# Altium footprint library con-samtec.PCBLIB: 805 footprints (part 31 of 55)
Each footprint in its own frame and in the unit in brackets; x right, y up, seen from the top. Pads: shape width x height; smd on the part's side, far side on the other; paste and mask are expansions set on the pad; w line width, h text height; cw(c..) or ccw(c..) is an arc to the next point about the centre after c.
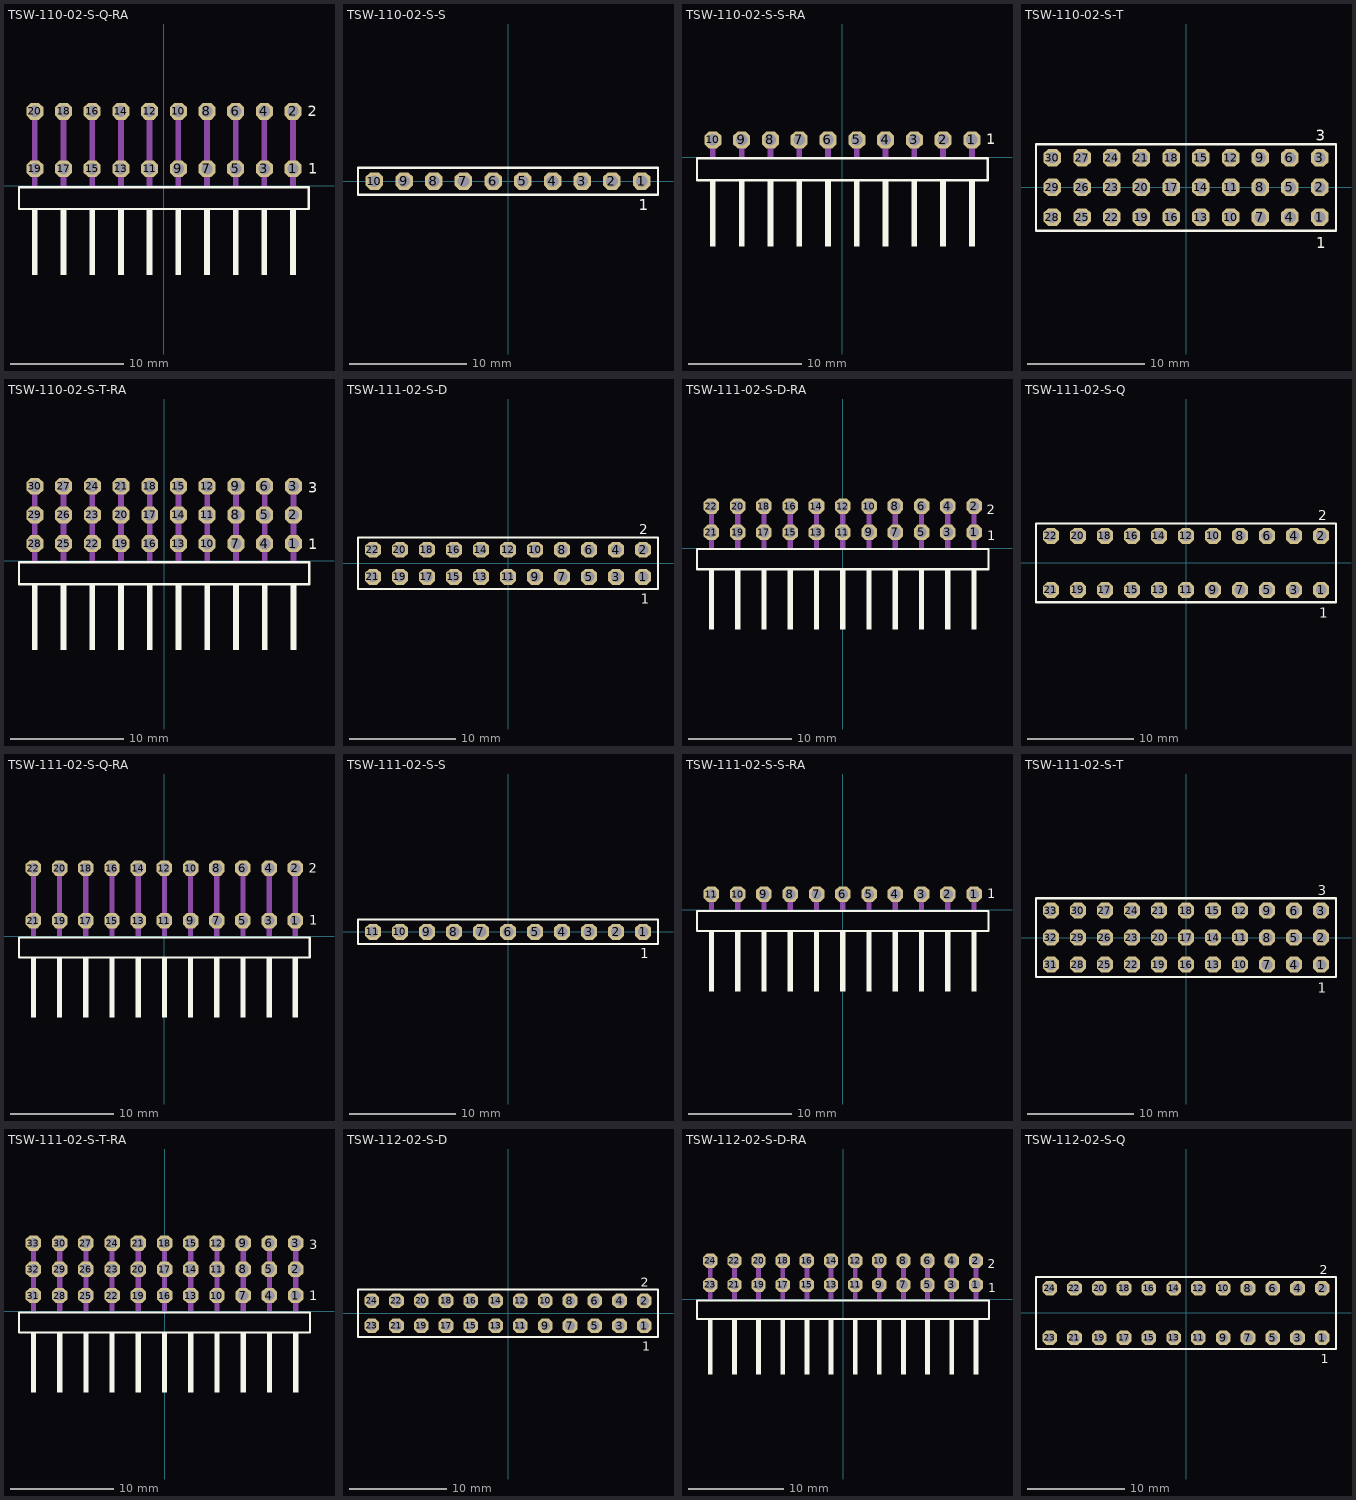
[diagram p30: the footprints below, top view; thin cyan lines are the x and y axes]

## TSW-110-02-S-Q-RA [mil]
pads (20):
  oct 59.06x59.06 hole 39.37: 1(450,60) 2(450,260) 3(350,60) 4(350,260) 5(250,60) 6(250,260) 7(150,60) 8(150,260) 9(50,60) 10(50,260) 11(-50,60) 12(-50,260) 13(-150,60) 14(-150,260) 15(-250,60) 16(-250,260) 17(-350,60) 18(-350,260) 19(-450,60) 20(-450,260)
Top Overlay:
  rectangle: -460,-310.63 -440,-80.32
  rectangle: -360,-310.63 -340,-80.32
  rectangle: -260,-310.63 -240,-80.32
  rectangle: -160,-310.63 -140,-80.32
  rectangle: -60,-310.63 -40,-80.32
  rectangle: 40,-310.63 60,-80.32
  rectangle: 140,-310.63 160,-80.32
  rectangle: 240,-310.63 260,-80.32
  rectangle: 340,-310.63 360,-80.32
  rectangle: 440,-310.63 460,-80.32
  lines w8: -505.08,-80.55 505.08,-80.55 505.08,-4.17 -505.08,-4.17 -505.08,-80.55
  text "1" at 503.54,43.31 h36.81
  text "2" at 501.18,242.72 h36.81
Mechanical 16:
  rectangle: -460,0 -440,270
  rectangle: -360,0 -340,270
  rectangle: -260,0 -240,270
  rectangle: -160,0 -140,270
  rectangle: -60,0 -40,270
  rectangle: 40,0 60,270
  rectangle: 140,0 160,270
  rectangle: 240,0 260,270
  rectangle: 340,0 360,270
  rectangle: 440,0 460,270

## TSW-110-02-S-S [mm]
pads (10):
  oct 1.5x1.5 hole 1: 1(11.43,0) 2(8.89,0) 3(6.35,0) 4(3.81,0) 5(1.27,0) 6(-1.27,0) 7(-3.81,0) 8(-6.35,0) 9(-8.89,0) 10(-11.43,0)
Top Overlay:
  lines w0.203: -12.829,-1.155 12.829,-1.155 12.829,1.155 -12.829,1.155 -12.829,-1.155
  text "1" at 11.172,-2.498 h0.94
Mechanical 16:
  rectangle: -11.78,-0.35 -11.08,0.35
  rectangle: -9.24,-0.35 -8.54,0.35
  rectangle: -6.7,-0.35 -6,0.35
  rectangle: -4.16,-0.35 -3.46,0.35
  rectangle: -1.62,-0.35 -0.92,0.35
  rectangle: 0.92,-0.35 1.62,0.35
  rectangle: 3.46,-0.35 4.16,0.35
  rectangle: 6,-0.35 6.7,0.35
  rectangle: 8.54,-0.35 9.24,0.35
  rectangle: 11.08,-0.35 11.78,0.35

## TSW-110-02-S-S-RA [mil]
pads (10):
  oct 59.06x59.06 hole 39.37: 1(450,60) 2(350,60) 3(250,60) 4(150,60) 5(50,60) 6(-50,60) 7(-150,60) 8(-250,60) 9(-350,60) 10(-450,60)
Top Overlay:
  rectangle: -460,-310.63 -440,-80.32
  rectangle: -360,-310.63 -340,-80.32
  rectangle: -260,-310.63 -240,-80.32
  rectangle: -160,-310.63 -140,-80.32
  rectangle: -60,-310.63 -40,-80.32
  rectangle: 40,-310.63 60,-80.32
  rectangle: 140,-310.63 160,-80.32
  rectangle: 240,-310.63 260,-80.32
  rectangle: 340,-310.63 360,-80.32
  rectangle: 440,-310.63 460,-80.32
  lines w8: -505.08,-80.55 505.08,-80.55 505.08,-4.17 -505.08,-4.17 -505.08,-80.55
  text "1" at 500.47,45.35 h36.81
Mechanical 16:
  rectangle: -460,0 -440,70
  rectangle: -360,0 -340,70
  rectangle: -260,0 -240,70
  rectangle: -160,0 -140,70
  rectangle: -60,0 -40,70
  rectangle: 40,0 60,70
  rectangle: 140,0 160,70
  rectangle: 240,0 260,70
  rectangle: 340,0 360,70
  rectangle: 440,0 460,70

## TSW-110-02-S-T [mm]
pads (30):
  oct 1.5x1.5 hole 1: 1(11.43,-2.54) 2(11.43,0) 3(11.43,2.54) 4(8.89,-2.54) 5(8.89,0) 6(8.89,2.54) 7(6.35,-2.54) 8(6.35,0) 9(6.35,2.54) 10(3.81,-2.54) 11(3.81,0) 12(3.81,2.54) 13(1.27,-2.54) 14(1.27,0) 15(1.27,2.54) 16(-1.27,-2.54) 17(-1.27,0) 18(-1.27,2.54) 19(-3.81,-2.54) 20(-3.81,0) 21(-3.81,2.54) 22(-6.35,-2.54) 23(-6.35,0) 24(-6.35,2.54) 25(-8.89,-2.54) 26(-8.89,0) 27(-8.89,2.54) 28(-11.43,-2.54) 29(-11.43,0) 30(-11.43,2.54)
Top Overlay:
  lines w0.203: -12.829,-3.695 12.829,-3.695 12.829,3.695 -12.829,3.695 -12.829,-3.695
  text "1" at 11.122,-5.188 h0.94
  text "3" at 11.118,3.989 h0.94
Mechanical 16:
  rectangle: -11.78,-2.89 -11.08,-2.19
  rectangle: -11.78,-0.35 -11.08,0.35
  rectangle: -11.78,2.19 -11.08,2.89
  rectangle: -9.24,-2.89 -8.54,-2.19
  rectangle: -9.24,-0.35 -8.54,0.35
  rectangle: -9.24,2.19 -8.54,2.89
  rectangle: -6.7,-2.89 -6,-2.19
  rectangle: -6.7,-0.35 -6,0.35
  rectangle: -6.7,2.19 -6,2.89
  rectangle: -4.16,-2.89 -3.46,-2.19
  rectangle: -4.16,-0.35 -3.46,0.35
  rectangle: -4.16,2.19 -3.46,2.89
  rectangle: -1.62,-2.89 -0.92,-2.19
  rectangle: -1.62,-0.35 -0.92,0.35
  rectangle: -1.62,2.19 -0.92,2.89
  rectangle: 0.92,-2.89 1.62,-2.19
  rectangle: 0.92,-0.35 1.62,0.35
  rectangle: 0.92,2.19 1.62,2.89
  rectangle: 3.46,-2.89 4.16,-2.19
  rectangle: 3.46,-0.35 4.16,0.35
  rectangle: 3.46,2.19 4.16,2.89
  rectangle: 6,-2.89 6.7,-2.19
  rectangle: 6,-0.35 6.7,0.35
  rectangle: 6,2.19 6.7,2.89
  rectangle: 8.54,-2.89 9.24,-2.19
  rectangle: 8.54,-0.35 9.24,0.35
  rectangle: 8.54,2.19 9.24,2.89
  rectangle: 11.08,-2.89 11.78,-2.19
  rectangle: 11.08,-0.35 11.78,0.35
  rectangle: 11.08,2.19 11.78,2.89

## TSW-110-02-S-T-RA [mil]
pads (30):
  oct 59.06x59.06 hole 39.37: 1(450,60) 2(450,160) 3(450,260) 4(350,60) 5(350,160) 6(350,260) 7(250,60) 8(250,160) 9(250,260) 10(150,60) 11(150,160) 12(150,260) 13(50,60) 14(50,160) 15(50,260) 16(-50,60) 17(-50,160) 18(-50,260) 19(-150,60) 20(-150,160) 21(-150,260) 22(-250,60) 23(-250,160) 24(-250,260) 25(-350,60) 26(-350,160) 27(-350,260) 28(-450,60) 29(-450,160) 30(-450,260)
Top Overlay:
  rectangle: -460,-310.63 -440,-80.32
  rectangle: -360,-310.63 -340,-80.32
  rectangle: -260,-310.63 -240,-80.32
  rectangle: -160,-310.63 -140,-80.32
  rectangle: -60,-310.63 -40,-80.32
  rectangle: 40,-310.63 60,-80.32
  rectangle: 140,-310.63 160,-80.32
  rectangle: 240,-310.63 260,-80.32
  rectangle: 340,-310.63 360,-80.32
  rectangle: 440,-310.63 460,-80.32
  lines w8: -505.08,-80.55 505.08,-80.55 505.08,-4.17 -505.08,-4.17 -505.08,-80.55
  text "1" at 501.57,41.34 h36.81
  text "3" at 502.17,236.81 h36.81
Mechanical 16:
  rectangle: -460,0 -440,270
  rectangle: -360,0 -340,270
  rectangle: -260,0 -240,270
  rectangle: -160,0 -140,270
  rectangle: -60,0 -40,270
  rectangle: 40,0 60,270
  rectangle: 140,0 160,270
  rectangle: 240,0 260,270
  rectangle: 340,0 360,270
  rectangle: 440,0 460,270

## TSW-111-02-S-D [mm]
pads (22):
  oct 1.5x1.5 hole 1: 1(12.7,-1.27) 2(12.7,1.27) 3(10.16,-1.27) 4(10.16,1.27) 5(7.62,-1.27) 6(7.62,1.27) 7(5.08,-1.27) 8(5.08,1.27) 9(2.54,-1.27) 10(2.54,1.27) 11(0,-1.27) 12(0,1.27) 13(-2.54,-1.27) 14(-2.54,1.27) 15(-5.08,-1.27) 16(-5.08,1.27) 17(-7.62,-1.27) 18(-7.62,1.27) 19(-10.16,-1.27) 20(-10.16,1.27) 21(-12.7,-1.27) 22(-12.7,1.27)
Top Overlay:
  lines w0.203: -14.099,-2.425 14.099,-2.425 14.099,2.425 -14.099,2.425 -14.099,-2.425
  text "1" at 12.492,-3.818 h0.94
  text "2" at 12.317,2.744 h0.94
Mechanical 16:
  rectangle: -13.05,-1.62 -12.35,-0.92
  rectangle: -13.05,0.92 -12.35,1.62
  rectangle: -10.51,-1.62 -9.81,-0.92
  rectangle: -10.51,0.92 -9.81,1.62
  rectangle: -7.97,-1.62 -7.27,-0.92
  rectangle: -7.97,0.92 -7.27,1.62
  rectangle: -5.43,-1.62 -4.73,-0.92
  rectangle: -5.43,0.92 -4.73,1.62
  rectangle: -2.89,-1.62 -2.19,-0.92
  rectangle: -2.89,0.92 -2.19,1.62
  rectangle: -0.35,-1.62 0.35,-0.92
  rectangle: -0.35,0.92 0.35,1.62
  rectangle: 2.19,-1.62 2.89,-0.92
  rectangle: 2.19,0.92 2.89,1.62
  rectangle: 4.73,-1.62 5.43,-0.92
  rectangle: 4.73,0.92 5.43,1.62
  rectangle: 7.27,-1.62 7.97,-0.92
  rectangle: 7.27,0.92 7.97,1.62
  rectangle: 9.81,-1.62 10.51,-0.92
  rectangle: 9.81,0.92 10.51,1.62
  rectangle: 12.35,-1.62 13.05,-0.92
  rectangle: 12.35,0.92 13.05,1.62

## TSW-111-02-S-D-RA [mil]
pads (22):
  oct 59.06x59.06 hole 39.37: 1(500,60) 2(500,160) 3(400,60) 4(400,160) 5(300,60) 6(300,160) 7(200,60) 8(200,160) 9(100,60) 10(100,160) 11(0,60) 12(0,160) 13(-100,60) 14(-100,160) 15(-200,60) 16(-200,160) 17(-300,60) 18(-300,160) 19(-400,60) 20(-400,160) 21(-500,60) 22(-500,160)
Top Overlay:
  rectangle: -510,-310.63 -490,-80.32
  rectangle: -410,-310.63 -390,-80.32
  rectangle: -310,-310.63 -290,-80.32
  rectangle: -210,-310.63 -190,-80.32
  rectangle: -110,-310.63 -90,-80.32
  rectangle: -10,-310.63 10,-80.32
  rectangle: 90,-310.63 110,-80.32
  rectangle: 190,-310.63 210,-80.32
  rectangle: 290,-310.63 310,-80.32
  rectangle: 390,-310.63 410,-80.32
  rectangle: 490,-310.63 510,-80.32
  lines w8: -555.08,-80.55 555.08,-80.55 555.08,-4.17 -555.08,-4.17 -555.08,-80.55
  text "1" at 550.59,30.51 h36.81
  text "2" at 549.21,129.53 h36.81
Mechanical 16:
  rectangle: -510,0 -490,170
  rectangle: -410,0 -390,170
  rectangle: -310,0 -290,170
  rectangle: -210,0 -190,170
  rectangle: -110,0 -90,170
  rectangle: -10,0 10,170
  rectangle: 90,0 110,170
  rectangle: 190,0 210,170
  rectangle: 290,0 310,170
  rectangle: 390,0 410,170
  rectangle: 490,0 510,170

## TSW-111-02-S-Q [mm]
pads (22):
  oct 1.5x1.5 hole 1: 1(12.7,-2.54) 2(12.7,2.54) 3(10.16,-2.54) 4(10.16,2.54) 5(7.62,-2.54) 6(7.62,2.54) 7(5.08,-2.54) 8(5.08,2.54) 9(2.54,-2.54) 10(2.54,2.54) 11(0,-2.54) 12(0,2.54) 13(-2.54,-2.54) 14(-2.54,2.54) 15(-5.08,-2.54) 16(-5.08,2.54) 17(-7.62,-2.54) 18(-7.62,2.54) 19(-10.16,-2.54) 20(-10.16,2.54) 21(-12.7,-2.54) 22(-12.7,2.54)
Top Overlay:
  lines w0.203: -14.099,-3.695 14.099,-3.695 14.099,3.695 -14.099,3.695 -14.099,-3.695
  text "1" at 12.542,-5.138 h0.94
  text "2" at 12.442,3.989 h0.94
Mechanical 16:
  rectangle: -13.05,-2.89 -12.35,-2.19
  rectangle: -13.05,2.19 -12.35,2.89
  rectangle: -10.51,-2.89 -9.81,-2.19
  rectangle: -10.51,2.19 -9.81,2.89
  rectangle: -7.97,-2.89 -7.27,-2.19
  rectangle: -7.97,2.19 -7.27,2.89
  rectangle: -5.43,-2.89 -4.73,-2.19
  rectangle: -5.43,2.19 -4.73,2.89
  rectangle: -2.89,-2.89 -2.19,-2.19
  rectangle: -2.89,2.19 -2.19,2.89
  rectangle: -0.35,-2.89 0.35,-2.19
  rectangle: -0.35,2.19 0.35,2.89
  rectangle: 2.19,-2.89 2.89,-2.19
  rectangle: 2.19,2.19 2.89,2.89
  rectangle: 4.73,-2.89 5.43,-2.19
  rectangle: 4.73,2.19 5.43,2.89
  rectangle: 7.27,-2.89 7.97,-2.19
  rectangle: 7.27,2.19 7.97,2.89
  rectangle: 9.81,-2.89 10.51,-2.19
  rectangle: 9.81,2.19 10.51,2.89
  rectangle: 12.35,-2.89 13.05,-2.19
  rectangle: 12.35,2.19 13.05,2.89

## TSW-111-02-S-Q-RA [mil]
pads (22):
  oct 59.06x59.06 hole 39.37: 1(500,60) 2(500,260) 3(400,60) 4(400,260) 5(300,60) 6(300,260) 7(200,60) 8(200,260) 9(100,60) 10(100,260) 11(0,60) 12(0,260) 13(-100,60) 14(-100,260) 15(-200,60) 16(-200,260) 17(-300,60) 18(-300,260) 19(-400,60) 20(-400,260) 21(-500,60) 22(-500,260)
Top Overlay:
  rectangle: -510,-310.63 -490,-80.32
  rectangle: -410,-310.63 -390,-80.32
  rectangle: -310,-310.63 -290,-80.32
  rectangle: -210,-310.63 -190,-80.32
  rectangle: -110,-310.63 -90,-80.32
  rectangle: -10,-310.63 10,-80.32
  rectangle: 90,-310.63 110,-80.32
  rectangle: 190,-310.63 210,-80.32
  rectangle: 290,-310.63 310,-80.32
  rectangle: 390,-310.63 410,-80.32
  rectangle: 490,-310.63 510,-80.32
  lines w8: -555.08,-80.55 555.08,-80.55 555.08,-4.17 -555.08,-4.17 -555.08,-80.55
  text "1" at 553.54,43.31 h36.81
  text "2" at 551.18,242.72 h36.81
Mechanical 16:
  rectangle: -510,0 -490,270
  rectangle: -410,0 -390,270
  rectangle: -310,0 -290,270
  rectangle: -210,0 -190,270
  rectangle: -110,0 -90,270
  rectangle: -10,0 10,270
  rectangle: 90,0 110,270
  rectangle: 190,0 210,270
  rectangle: 290,0 310,270
  rectangle: 390,0 410,270
  rectangle: 490,0 510,270

## TSW-111-02-S-S [mm]
pads (11):
  oct 1.5x1.5 hole 1: 1(12.7,0) 2(10.16,0) 3(7.62,0) 4(5.08,0) 5(2.54,0) 6(0,0) 7(-2.54,0) 8(-5.08,0) 9(-7.62,0) 10(-10.16,0) 11(-12.7,0)
Top Overlay:
  lines w0.203: -14.099,-1.155 14.099,-1.155 14.099,1.155 -14.099,1.155 -14.099,-1.155
  text "1" at 12.442,-2.498 h0.94
Mechanical 16:
  rectangle: -13.05,-0.35 -12.35,0.35
  rectangle: -10.51,-0.35 -9.81,0.35
  rectangle: -7.97,-0.35 -7.27,0.35
  rectangle: -5.43,-0.35 -4.73,0.35
  rectangle: -2.89,-0.35 -2.19,0.35
  rectangle: -0.35,-0.35 0.35,0.35
  rectangle: 2.19,-0.35 2.89,0.35
  rectangle: 4.73,-0.35 5.43,0.35
  rectangle: 7.27,-0.35 7.97,0.35
  rectangle: 9.81,-0.35 10.51,0.35
  rectangle: 12.35,-0.35 13.05,0.35

## TSW-111-02-S-S-RA [mil]
pads (11):
  oct 59.06x59.06 hole 39.37: 1(500,60) 2(400,60) 3(300,60) 4(200,60) 5(100,60) 6(0,60) 7(-100,60) 8(-200,60) 9(-300,60) 10(-400,60) 11(-500,60)
Top Overlay:
  rectangle: -510,-310.63 -490,-80.32
  rectangle: -410,-310.63 -390,-80.32
  rectangle: -310,-310.63 -290,-80.32
  rectangle: -210,-310.63 -190,-80.32
  rectangle: -110,-310.63 -90,-80.32
  rectangle: -10,-310.63 10,-80.32
  rectangle: 90,-310.63 110,-80.32
  rectangle: 190,-310.63 210,-80.32
  rectangle: 290,-310.63 310,-80.32
  rectangle: 390,-310.63 410,-80.32
  rectangle: 490,-310.63 510,-80.32
  lines w8: -555.08,-80.55 555.08,-80.55 555.08,-4.17 -555.08,-4.17 -555.08,-80.55
  text "1" at 550.47,45.35 h36.81
Mechanical 16:
  rectangle: -510,0 -490,70
  rectangle: -410,0 -390,70
  rectangle: -310,0 -290,70
  rectangle: -210,0 -190,70
  rectangle: -110,0 -90,70
  rectangle: -10,0 10,70
  rectangle: 90,0 110,70
  rectangle: 190,0 210,70
  rectangle: 290,0 310,70
  rectangle: 390,0 410,70
  rectangle: 490,0 510,70

## TSW-111-02-S-T [mm]
pads (33):
  oct 1.5x1.5 hole 1: 1(12.7,-2.54) 2(12.7,0) 3(12.7,2.54) 4(10.16,-2.54) 5(10.16,0) 6(10.16,2.54) 7(7.62,-2.54) 8(7.62,0) 9(7.62,2.54) 10(5.08,-2.54) 11(5.08,0) 12(5.08,2.54) 13(2.54,-2.54) 14(2.54,0) 15(2.54,2.54) 16(0,-2.54) 17(0,0) 18(0,2.54) 19(-2.54,-2.54) 20(-2.54,0) 21(-2.54,2.54) 22(-5.08,-2.54) 23(-5.08,0) 24(-5.08,2.54) 25(-7.62,-2.54) 26(-7.62,0) 27(-7.62,2.54) 28(-10.16,-2.54) 29(-10.16,0) 30(-10.16,2.54) 31(-12.7,-2.54) 32(-12.7,0) 33(-12.7,2.54)
Top Overlay:
  lines w0.203: -14.099,-3.695 14.099,-3.695 14.099,3.695 -14.099,3.695 -14.099,-3.695
  text "1" at 12.392,-5.188 h0.94
  text "3" at 12.388,3.989 h0.94
Mechanical 16:
  rectangle: -13.05,-2.89 -12.35,-2.19
  rectangle: -13.05,-0.35 -12.35,0.35
  rectangle: -13.05,2.19 -12.35,2.89
  rectangle: -10.51,-2.89 -9.81,-2.19
  rectangle: -10.51,-0.35 -9.81,0.35
  rectangle: -10.51,2.19 -9.81,2.89
  rectangle: -7.97,-2.89 -7.27,-2.19
  rectangle: -7.97,-0.35 -7.27,0.35
  rectangle: -7.97,2.19 -7.27,2.89
  rectangle: -5.43,-2.89 -4.73,-2.19
  rectangle: -5.43,-0.35 -4.73,0.35
  rectangle: -5.43,2.19 -4.73,2.89
  rectangle: -2.89,-2.89 -2.19,-2.19
  rectangle: -2.89,-0.35 -2.19,0.35
  rectangle: -2.89,2.19 -2.19,2.89
  rectangle: -0.35,-2.89 0.35,-2.19
  rectangle: -0.35,-0.35 0.35,0.35
  rectangle: -0.35,2.19 0.35,2.89
  rectangle: 2.19,-2.89 2.89,-2.19
  rectangle: 2.19,-0.35 2.89,0.35
  rectangle: 2.19,2.19 2.89,2.89
  rectangle: 4.73,-2.89 5.43,-2.19
  rectangle: 4.73,-0.35 5.43,0.35
  rectangle: 4.73,2.19 5.43,2.89
  rectangle: 7.27,-2.89 7.97,-2.19
  rectangle: 7.27,-0.35 7.97,0.35
  rectangle: 7.27,2.19 7.97,2.89
  rectangle: 9.81,-2.89 10.51,-2.19
  rectangle: 9.81,-0.35 10.51,0.35
  rectangle: 9.81,2.19 10.51,2.89
  rectangle: 12.35,-2.89 13.05,-2.19
  rectangle: 12.35,-0.35 13.05,0.35
  rectangle: 12.35,2.19 13.05,2.89

## TSW-111-02-S-T-RA [mil]
pads (33):
  oct 59.06x59.06 hole 39.37: 1(500,60) 2(500,160) 3(500,260) 4(400,60) 5(400,160) 6(400,260) 7(300,60) 8(300,160) 9(300,260) 10(200,60) 11(200,160) 12(200,260) 13(100,60) 14(100,160) 15(100,260) 16(0,60) 17(0,160) 18(0,260) 19(-100,60) 20(-100,160) 21(-100,260) 22(-200,60) 23(-200,160) 24(-200,260) 25(-300,60) 26(-300,160) 27(-300,260) 28(-400,60) 29(-400,160) 30(-400,260) 31(-500,60) 32(-500,160) 33(-500,260)
Top Overlay:
  rectangle: -510,-310.63 -490,-80.32
  rectangle: -410,-310.63 -390,-80.32
  rectangle: -310,-310.63 -290,-80.32
  rectangle: -210,-310.63 -190,-80.32
  rectangle: -110,-310.63 -90,-80.32
  rectangle: -10,-310.63 10,-80.32
  rectangle: 90,-310.63 110,-80.32
  rectangle: 190,-310.63 210,-80.32
  rectangle: 290,-310.63 310,-80.32
  rectangle: 390,-310.63 410,-80.32
  rectangle: 490,-310.63 510,-80.32
  lines w8: -555.08,-80.55 555.08,-80.55 555.08,-4.17 -555.08,-4.17 -555.08,-80.55
  text "1" at 551.57,41.34 h36.81
  text "3" at 552.17,236.81 h36.81
Mechanical 16:
  rectangle: -510,0 -490,270
  rectangle: -410,0 -390,270
  rectangle: -310,0 -290,270
  rectangle: -210,0 -190,270
  rectangle: -110,0 -90,270
  rectangle: -10,0 10,270
  rectangle: 90,0 110,270
  rectangle: 190,0 210,270
  rectangle: 290,0 310,270
  rectangle: 390,0 410,270
  rectangle: 490,0 510,270

## TSW-112-02-S-D [mm]
pads (24):
  oct 1.5x1.5 hole 1: 1(13.97,-1.27) 2(13.97,1.27) 3(11.43,-1.27) 4(11.43,1.27) 5(8.89,-1.27) 6(8.89,1.27) 7(6.35,-1.27) 8(6.35,1.27) 9(3.81,-1.27) 10(3.81,1.27) 11(1.27,-1.27) 12(1.27,1.27) 13(-1.27,-1.27) 14(-1.27,1.27) 15(-3.81,-1.27) 16(-3.81,1.27) 17(-6.35,-1.27) 18(-6.35,1.27) 19(-8.89,-1.27) 20(-8.89,1.27) 21(-11.43,-1.27) 22(-11.43,1.27) 23(-13.97,-1.27) 24(-13.97,1.27)
Top Overlay:
  lines w0.203: -15.369,-2.425 15.369,-2.425 15.369,2.425 -15.369,2.425 -15.369,-2.425
  text "1" at 13.762,-3.818 h0.94
  text "2" at 13.587,2.744 h0.94
Mechanical 16:
  rectangle: -14.32,-1.62 -13.62,-0.92
  rectangle: -14.32,0.92 -13.62,1.62
  rectangle: -11.78,-1.62 -11.08,-0.92
  rectangle: -11.78,0.92 -11.08,1.62
  rectangle: -9.24,-1.62 -8.54,-0.92
  rectangle: -9.24,0.92 -8.54,1.62
  rectangle: -6.7,-1.62 -6,-0.92
  rectangle: -6.7,0.92 -6,1.62
  rectangle: -4.16,-1.62 -3.46,-0.92
  rectangle: -4.16,0.92 -3.46,1.62
  rectangle: -1.62,-1.62 -0.92,-0.92
  rectangle: -1.62,0.92 -0.92,1.62
  rectangle: 0.92,-1.62 1.62,-0.92
  rectangle: 0.92,0.92 1.62,1.62
  rectangle: 3.46,-1.62 4.16,-0.92
  rectangle: 3.46,0.92 4.16,1.62
  rectangle: 6,-1.62 6.7,-0.92
  rectangle: 6,0.92 6.7,1.62
  rectangle: 8.54,-1.62 9.24,-0.92
  rectangle: 8.54,0.92 9.24,1.62
  rectangle: 11.08,-1.62 11.78,-0.92
  rectangle: 11.08,0.92 11.78,1.62
  rectangle: 13.62,-1.62 14.32,-0.92
  rectangle: 13.62,0.92 14.32,1.62

## TSW-112-02-S-D-RA [mil]
pads (24):
  oct 59.06x59.06 hole 39.37: 1(550,60) 2(550,160) 3(450,60) 4(450,160) 5(350,60) 6(350,160) 7(250,60) 8(250,160) 9(150,60) 10(150,160) 11(50,60) 12(50,160) 13(-50,60) 14(-50,160) 15(-150,60) 16(-150,160) 17(-250,60) 18(-250,160) 19(-350,60) 20(-350,160) 21(-450,60) 22(-450,160) 23(-550,60) 24(-550,160)
Top Overlay:
  rectangle: -560,-310.63 -540,-80.32
  rectangle: -460,-310.63 -440,-80.32
  rectangle: -360,-310.63 -340,-80.32
  rectangle: -260,-310.63 -240,-80.32
  rectangle: -160,-310.63 -140,-80.32
  rectangle: -60,-310.63 -40,-80.32
  rectangle: 40,-310.63 60,-80.32
  rectangle: 140,-310.63 160,-80.32
  rectangle: 240,-310.63 260,-80.32
  rectangle: 340,-310.63 360,-80.32
  rectangle: 440,-310.63 460,-80.32
  rectangle: 540,-310.63 560,-80.32
  lines w8: -605.08,-80.55 605.08,-80.55 605.08,-4.17 -605.08,-4.17 -605.08,-80.55
  text "1" at 600.59,30.51 h36.81
  text "2" at 599.21,129.53 h36.81
Mechanical 16:
  rectangle: -560,0 -540,170
  rectangle: -460,0 -440,170
  rectangle: -360,0 -340,170
  rectangle: -260,0 -240,170
  rectangle: -160,0 -140,170
  rectangle: -60,0 -40,170
  rectangle: 40,0 60,170
  rectangle: 140,0 160,170
  rectangle: 240,0 260,170
  rectangle: 340,0 360,170
  rectangle: 440,0 460,170
  rectangle: 540,0 560,170

## TSW-112-02-S-Q [mm]
pads (24):
  oct 1.5x1.5 hole 1: 1(13.97,-2.54) 2(13.97,2.54) 3(11.43,-2.54) 4(11.43,2.54) 5(8.89,-2.54) 6(8.89,2.54) 7(6.35,-2.54) 8(6.35,2.54) 9(3.81,-2.54) 10(3.81,2.54) 11(1.27,-2.54) 12(1.27,2.54) 13(-1.27,-2.54) 14(-1.27,2.54) 15(-3.81,-2.54) 16(-3.81,2.54) 17(-6.35,-2.54) 18(-6.35,2.54) 19(-8.89,-2.54) 20(-8.89,2.54) 21(-11.43,-2.54) 22(-11.43,2.54) 23(-13.97,-2.54) 24(-13.97,2.54)
Top Overlay:
  lines w0.203: -15.369,-3.695 15.369,-3.695 15.369,3.695 -15.369,3.695 -15.369,-3.695
  text "1" at 13.812,-5.138 h0.94
  text "2" at 13.712,3.989 h0.94
Mechanical 16:
  rectangle: -14.32,-2.89 -13.62,-2.19
  rectangle: -14.32,2.19 -13.62,2.89
  rectangle: -11.78,-2.89 -11.08,-2.19
  rectangle: -11.78,2.19 -11.08,2.89
  rectangle: -9.24,-2.89 -8.54,-2.19
  rectangle: -9.24,2.19 -8.54,2.89
  rectangle: -6.7,-2.89 -6,-2.19
  rectangle: -6.7,2.19 -6,2.89
  rectangle: -4.16,-2.89 -3.46,-2.19
  rectangle: -4.16,2.19 -3.46,2.89
  rectangle: -1.62,-2.89 -0.92,-2.19
  rectangle: -1.62,2.19 -0.92,2.89
  rectangle: 0.92,-2.89 1.62,-2.19
  rectangle: 0.92,2.19 1.62,2.89
  rectangle: 3.46,-2.89 4.16,-2.19
  rectangle: 3.46,2.19 4.16,2.89
  rectangle: 6,-2.89 6.7,-2.19
  rectangle: 6,2.19 6.7,2.89
  rectangle: 8.54,-2.89 9.24,-2.19
  rectangle: 8.54,2.19 9.24,2.89
  rectangle: 11.08,-2.89 11.78,-2.19
  rectangle: 11.08,2.19 11.78,2.89
  rectangle: 13.62,-2.89 14.32,-2.19
  rectangle: 13.62,2.19 14.32,2.89